# Altium footprint library SAMTEC SMD.PcbLib: 165 footprints (part 13 of 17) (continued)
## SAMTEC_SEAF-20-01-S-10-2-RA-GP-TR [mm] "200 Contacts in 10 rows (20 Pin per Row), Hi-Density Right Angle Open Pin Field Connector (Guide Post Option)" (continued)
  round 0.5 hole 1.3 unplated mask+0.4: MEC1(15.365,0) MEC2(-15.365,0)
  round 1.85 hole 1.15: MEC3(16.385,-6.16) MEC4(16.385,4.38) MEC5(-16.385,-6.16) MEC6(-16.385,4.38)
Top Overlay:
  lines w0.2: -15.964,-13.412 -15.9,-14.682 -14.122,-14.682 -14.059,-13.412 ; -14.097,7.975 -14.097,6.451 -16.129,6.451 ; -12.916,-2.744 -13.411,-2.744 -13.411,3.86 13.411,3.86 13.411,-2.744 12.256,-2.744 ; 14.059,-13.412 14.122,-14.682 15.9,-14.682 15.964,-13.412 ; 14.097,7.975 14.097,6.451 16.129,6.451 ; -16.129,6.451 -16.129,7.975 16.129,7.975 16.129,6.451 ; -16.129,6.451 -22.479,6.451 -22.479,-8.332 -16.04,-8.332 -16.04,-13.412 16.04,-13.412 16.04,-8.332 22.479,-8.332 22.479,6.451 16.129,6.451
  text "200" at 14.9,-12.5 h1.2
  text "1" at -12.575,1.35 h1.2
Mechanical 8:
  drawing of 156 lines, arcs and shapes, not listed
Mechanical 14:
  lines w0.1: -15.964,-13.412 -15.9,-14.682 -14.122,-14.682 -14.059,-13.412 ; -14.097,7.975 -14.097,6.451 -16.129,6.451 ; -12.802,-13.412 -12.802,-2.744 ; 12.802,-13.412 12.802,-2.744 ; 14.059,-13.412 14.122,-14.682 15.9,-14.682 15.964,-13.412 ; 14.097,7.975 14.097,6.451 16.129,6.451 ; -16.129,6.451 -16.129,7.975 16.129,7.975 16.129,6.451 ; -16.129,6.451 -22.479,6.451 -22.479,-8.332 -16.04,-8.332 -16.04,-13.412 16.04,-13.412 16.04,-8.332 22.479,-8.332 22.479,6.451 16.129,6.451 ; -13.411,-2.744 -13.411,3.86 13.411,3.86 13.411,-2.744 -13.411,-2.744
  text "200" at 14.9,-12.5 h1.2
  text "1" at -12.575,1.35 h1.2
Mechanical 15:
  lines w0.05: -22.729,-8.556 -16.29,-8.556 -16.29,-14.932 16.29,-14.932 16.29,-8.556 22.729,-8.556 22.729,6.727 16.379,6.727 16.379,8.251 -16.379,8.251 -16.379,6.727 -22.729,6.727 -22.729,-8.556
3D body "SAMTEC_SEAF-20-01-S-10-2-RA-GP-TR.stp": height 15.54, standoff 0, extent -22.479,-14.682 22.479,7.975

## SAMTEC_SEAF-30-01-L-10-2-RA-GP [mm] "300 Contacts in 10 rows (30 Pin per Row), Hi-Density Right Angle Open Pin Field Connector (Guide Post Option)"
height 15.53
pads (306):
  oval 0.84x0.63 smd paste+0.1: 1(-18.745,0) 2(-18.745,-2.159) 3(-18.745,-3.429) 4(-18.745,-4.699) 5(-18.745,-5.969) 6(-18.745,-7.239) 7(-18.745,-8.509) 8(-18.745,-9.779) 9(-18.745,-11.049) 10(-18.745,-12.319) 11(-17.475,0) 12(-17.475,-2.159) 13(-17.475,-3.429) 14(-17.475,-4.699) 15(-17.475,-5.969) 16(-17.475,-7.239) 17(-17.475,-8.509) 18(-17.475,-9.779) 19(-17.475,-11.049) 20(-17.475,-12.319) 21(-16.205,0) 22(-16.205,-2.159) 23(-16.205,-3.429) 24(-16.205,-4.699) 25(-16.205,-5.969) 26(-16.205,-7.239) 27(-16.205,-8.509) 28(-16.205,-9.779) 29(-16.205,-11.049) 30(-16.205,-12.319) 31(-14.935,0) 32(-14.935,-2.159) 33(-14.935,-3.429) 34(-14.935,-4.699) 35(-14.935,-5.969) 36(-14.935,-7.239) 37(-14.935,-8.509) 38(-14.935,-9.779) 39(-14.935,-11.049) 40(-14.935,-12.319) 41(-13.665,0) 42(-13.665,-2.159) 43(-13.665,-3.429) 44(-13.665,-4.699) 45(-13.665,-5.969) 46(-13.665,-7.239) 47(-13.665,-8.509) 48(-13.665,-9.779) 49(-13.665,-11.049) 50(-13.665,-12.319) 51(-12.395,0) 52(-12.395,-2.159) 53(-12.395,-3.429) 54(-12.395,-4.699) 55(-12.395,-5.969) 56(-12.395,-7.239) 57(-12.395,-8.509) 58(-12.395,-9.779) 59(-12.395,-11.049) 60(-12.395,-12.319) 61(-11.125,0) 62(-11.125,-2.159) 63(-11.125,-3.429) 64(-11.125,-4.699) 65(-11.125,-5.969) 66(-11.125,-7.239) 67(-11.125,-8.509) 68(-11.125,-9.779) 69(-11.125,-11.049) 70(-11.125,-12.319) 71(-9.855,0) 72(-9.855,-2.159) 73(-9.855,-3.429) 74(-9.855,-4.699) 75(-9.855,-5.969) 76(-9.855,-7.239) 77(-9.855,-8.509) 78(-9.855,-9.779) 79(-9.855,-11.049) 80(-9.855,-12.319) 81(-8.585,0) 82(-8.585,-2.159) 83(-8.585,-3.429) 84(-8.585,-4.699) 85(-8.585,-5.969) 86(-8.585,-7.239) 87(-8.585,-8.509) 88(-8.585,-9.779) 89(-8.585,-11.049) 90(-8.585,-12.319) 91(-7.315,0) 92(-7.315,-2.159) 93(-7.315,-3.429) 94(-7.315,-4.699) 95(-7.315,-5.969) 96(-7.315,-7.239) 97(-7.315,-8.509) 98(-7.315,-9.779) 99(-7.315,-11.049) 100(-7.315,-12.319) 101(-6.045,0) 102(-6.045,-2.159) 103(-6.045,-3.429) 104(-6.045,-4.699) 105(-6.045,-5.969) 106(-6.045,-7.239) 107(-6.045,-8.509) 108(-6.045,-9.779) 109(-6.045,-11.049) 110(-6.045,-12.319) 111(-4.775,0) 112(-4.775,-2.159) 113(-4.775,-3.429) 114(-4.775,-4.699) 115(-4.775,-5.969) 116(-4.775,-7.239) 117(-4.775,-8.509) 118(-4.775,-9.779) 119(-4.775,-11.049) 120(-4.775,-12.319) 121(-3.505,0) 122(-3.505,-2.159) 123(-3.505,-3.429) 124(-3.505,-4.699) 125(-3.505,-5.969) 126(-3.505,-7.239) 127(-3.505,-8.509) 128(-3.505,-9.779) 129(-3.505,-11.049) 130(-3.505,-12.319) 131(-2.235,0) 132(-2.235,-2.159) 133(-2.235,-3.429) 134(-2.235,-4.699) 135(-2.235,-5.969) 136(-2.235,-7.239) 137(-2.235,-8.509) 138(-2.235,-9.779) 139(-2.235,-11.049) 140(-2.235,-12.319) 141(-0.965,0) 142(-0.965,-2.159) 143(-0.965,-3.429) 144(-0.965,-4.699) 145(-0.965,-5.969) 146(-0.965,-7.239) 147(-0.965,-8.509) 148(-0.965,-9.779) 149(-0.965,-11.049) 150(-0.965,-12.319) 151(0.305,0) 152(0.305,-2.159) 153(0.305,-3.429) 154(0.305,-4.699) 155(0.305,-5.969) 156(0.305,-7.239) 157(0.305,-8.509) 158(0.305,-9.779) 159(0.305,-11.049) 160(0.305,-12.319) 161(1.575,0) 162(1.575,-2.159) 163(1.575,-3.429) 164(1.575,-4.699) 165(1.575,-5.969) 166(1.575,-7.239) 167(1.575,-8.509) 168(1.575,-9.779) 169(1.575,-11.049) 170(1.575,-12.319) 171(2.845,0) 172(2.845,-2.159) 173(2.845,-3.429) 174(2.845,-4.699) 175(2.845,-5.969) 176(2.845,-7.239) 177(2.845,-8.509) 178(2.845,-9.779) 179(2.845,-11.049) 180(2.845,-12.319) 181(4.115,0) 182(4.115,-2.159) 183(4.115,-3.429) 184(4.115,-4.699) 185(4.115,-5.969) 186(4.115,-7.239) 187(4.115,-8.509) 188(4.115,-9.779) 189(4.115,-11.049) 190(4.115,-12.319) 191(5.385,0) 192(5.385,-2.159) 193(5.385,-3.429) 194(5.385,-4.699) 195(5.385,-5.969) 196(5.385,-7.239) 197(5.385,-8.509) 198(5.385,-9.779) 199(5.385,-11.049) 200(5.385,-12.319) 201(6.655,0) 202(6.655,-2.159) 203(6.655,-3.429) 204(6.655,-4.699) 205(6.655,-5.969) 206(6.655,-7.239) 207(6.655,-8.509) 208(6.655,-9.779) 209(6.655,-11.049) 210(6.655,-12.319) 211(7.925,0) 212(7.925,-2.159) 213(7.925,-3.429) 214(7.925,-4.699) 215(7.925,-5.969) 216(7.925,-7.239) 217(7.925,-8.509) 218(7.925,-9.779) 219(7.925,-11.049) 220(7.925,-12.319) 221(9.195,0) 222(9.195,-2.159) 223(9.195,-3.429) 224(9.195,-4.699) 225(9.195,-5.969) 226(9.195,-7.239) 227(9.195,-8.509) 228(9.195,-9.779) 229(9.195,-11.049) 230(9.195,-12.319) 231(10.465,0) 232(10.465,-2.159) 233(10.465,-3.429) 234(10.465,-4.699) 235(10.465,-5.969) 236(10.465,-7.239) 237(10.465,-8.509) 238(10.465,-9.779) 239(10.465,-11.049) 240(10.465,-12.319) 241(11.735,0) 242(11.735,-2.159) 243(11.735,-3.429) 244(11.735,-4.699) 245(11.735,-5.969) 246(11.735,-7.239) 247(11.735,-8.509) 248(11.735,-9.779) 249(11.735,-11.049) 250(11.735,-12.319) 251(13.005,0) 252(13.005,-2.159) 253(13.005,-3.429) 254(13.005,-4.699) 255(13.005,-5.969) 256(13.005,-7.239) 257(13.005,-8.509) 258(13.005,-9.779) 259(13.005,-11.049) 260(13.005,-12.319) 261(14.275,0) 262(14.275,-2.159) 263(14.275,-3.429) 264(14.275,-4.699) 265(14.275,-5.969) 266(14.275,-7.239) 267(14.275,-8.509) 268(14.275,-9.779) 269(14.275,-11.049) 270(14.275,-12.319) 271(15.545,0) 272(15.545,-2.159) 273(15.545,-3.429) 274(15.545,-4.699) 275(15.545,-5.969) 276(15.545,-7.239) 277(15.545,-8.509) 278(15.545,-9.779) 279(15.545,-11.049) 280(15.545,-12.319) 281(16.815,0) 282(16.815,-2.159) 283(16.815,-3.429) 284(16.815,-4.699) 285(16.815,-5.969) 286(16.815,-7.239) 287(16.815,-8.509) 288(16.815,-9.779) 289(16.815,-11.049) 290(16.815,-12.319) 291(18.085,0) 292(18.085,-2.159) 293(18.085,-3.429) 294(18.085,-4.699) 295(18.085,-5.969) 296(18.085,-7.239) 297(18.085,-8.509) 298(18.085,-9.779) 299(18.085,-11.049) 300(18.085,-12.319)
  round 0.5 hole 1.3 unplated mask+0.4: MEC1(21.715,0) MEC2(-21.715,0)
  round 1.85 hole 1.15: MEC3(22.735,-6.16) MEC4(22.735,4.38) MEC5(-22.735,-6.16) MEC6(-22.735,4.38)
Top Overlay:
  lines w0.2: -22.479,6.477 -22.479,8.001 22.479,8.001 22.479,6.477 ; -22.167,8.001 -21.717,7.301 -21.267,8.001 ; -21.311,-13.386 -21.311,-14.58 -18.517,-14.58 ; -20.447,8.001 -20.447,6.477 -28.829,6.477 -28.829,-8.306 -24.435,-8.306 -24.435,-13.386 -18.517,-13.386 -18.517,-14.961 22.911,-14.961 22.911,-13.386 ; -19.812,-2.718 -19.812,3.886 19.685,3.886 19.685,-2.718 19.152,-2.718 19.152,-13.386 24.943,-13.386 24.943,-8.306 28.829,-8.306 28.829,6.477 20.447,6.477 20.447,8.001
  text "1" at -18.925,1.35 h1.2
  text "300" at 21.25,-12.5 h1.2
Mechanical 8:
  lines w0.05: -23.235,-6.16 -22.735,-6.16 ; -23.235,4.38 -22.735,4.38 ; -22.735,-6.66 -22.735,-6.16 ; -22.735,-5.66 -22.735,-6.16 ; -22.735,3.88 -22.735,4.38 ; -22.735,4.88 -22.735,4.38 ; -22.235,-6.16 -22.735,-6.16 ; -22.235,4.38 -22.735,4.38 ; -22.215,0 -21.715,0 ; -21.715,-0.5 -21.715,0 ; -21.715,0.5 -21.715,0 ; -21.215,0 -21.715,0 ; -19.245,-12.32 -18.745,-12.32 ; -19.245,-11.05 -18.745,-11.05 ; -19.245,-9.78 -18.745,-9.78 ; -19.245,-8.51 -18.745,-8.51 ; -19.245,-7.24 -18.745,-7.24 ; -19.245,-5.97 -18.745,-5.97 ; -19.245,-4.7 -18.745,-4.7 ; -19.245,-3.43 -18.745,-3.43 ; -19.245,-2.16 -18.745,-2.16 ; -19.245,0 -18.745,0 ; -18.745,-12.82 -18.745,-12.32 ; -18.745,-11.82 -18.745,-12.32 ; -18.745,-11.55 -18.745,-11.05 ; -18.745,-10.55 -18.745,-11.05 ; -18.745,-10.28 -18.745,-9.78 ; -18.745,-9.28 -18.745,-9.78 ; -18.745,-9.01 -18.745,-8.51 ; -18.745,-8.01 -18.745,-8.51 ; -18.745,-7.74 -18.745,-7.24 ; -18.745,-6.74 -18.745,-7.24 ; -18.745,-6.47 -18.745,-5.97 ; -18.745,-5.47 -18.745,-5.97 ; -18.745,-5.2 -18.745,-4.7 ; -18.745,-4.2 -18.745,-4.7 ; -18.745,-3.93 -18.745,-3.43 ; -18.745,-2.93 -18.745,-3.43 ; -18.745,-2.66 -18.745,-2.16 ; -18.745,-1.66 -18.745,-2.16 ; -18.745,-0.5 -18.745,0 ; -18.745,0.5 -18.745,0 ; -18.245,-12.32 -18.745,-12.32 ; -18.245,-11.05 -18.745,-11.05 ; -18.245,-9.78 -18.745,-9.78 ; -18.245,-8.51 -18.745,-8.51 ; -18.245,-7.24 -18.745,-7.24 ; -18.245,-5.97 -18.745,-5.97 ; -18.245,-4.7 -18.745,-4.7 ; -18.245,-3.43 -18.745,-3.43 ; -18.245,-2.16 -18.745,-2.16 ; -18.245,0 -18.745,0 ; -0.5,0 0,0 ; -0.195,0 0.305,0 ; 0,-0.5 0,0 ; 0,0.5 0,0 ; 0.305,-0.5 0.305,0 ; 0.305,0.5 0.305,0 ; 0.5,0 0,0 ; 0.805,0 0.305,0 ; 17.585,-12.32 18.085,-12.32 ; 17.585,-11.05 18.085,-11.05 ; 17.585,-9.78 18.085,-9.78 ; 17.585,-8.51 18.085,-8.51 ; 17.585,-7.24 18.085,-7.24 ; 17.585,-5.97 18.085,-5.97 ; 17.585,-4.7 18.085,-4.7 ; 17.585,-3.43 18.085,-3.43 ; 17.585,-2.16 18.085,-2.16 ; 17.585,0 18.085,0 ; 18.085,-12.82 18.085,-12.32 ; 18.085,-11.82 18.085,-12.32 ; 18.085,-11.55 18.085,-11.05 ; 18.085,-10.55 18.085,-11.05 ; 18.085,-10.28 18.085,-9.78 ; 18.085,-9.28 18.085,-9.78 ; 18.085,-9.01 18.085,-8.51 ; 18.085,-8.01 18.085,-8.51 ; 18.085,-7.74 18.085,-7.24 ; 18.085,-6.74 18.085,-7.24 ; 18.085,-6.47 18.085,-5.97 ; 18.085,-5.47 18.085,-5.97 ; 18.085,-5.2 18.085,-4.7 ; 18.085,-4.2 18.085,-4.7 ; 18.085,-3.93 18.085,-3.43 ; 18.085,-2.93 18.085,-3.43 ; 18.085,-2.66 18.085,-2.16 ; 18.085,-1.66 18.085,-2.16 ; 18.085,-0.5 18.085,0 ; 18.085,0.5 18.085,0 ; 18.585,-12.32 18.085,-12.32 ; 18.585,-11.05 18.085,-11.05 ; 18.585,-9.78 18.085,-9.78 ; 18.585,-8.51 18.085,-8.51 ; 18.585,-7.24 18.085,-7.24 ; 18.585,-5.97 18.085,-5.97 ; 18.585,-4.7 18.085,-4.7 ; 18.585,-3.43 18.085,-3.43 ; 18.585,-2.16 18.085,-2.16 ; 18.585,0 18.085,0 ; 21.215,0 21.715,0 ; 21.715,-0.5 21.715,0 ; 21.715,0.5 21.715,0 ; 22.215,0 21.715,0 ; 22.235,-6.16 22.735,-6.16 ; 22.235,4.38 22.735,4.38 ; 22.735,-6.66 22.735,-6.16 ; 22.735,-5.66 22.735,-6.16 ; 22.735,3.88 22.735,4.38 ; 22.735,4.88 22.735,4.38 ; 23.235,-6.16 22.735,-6.16 ; 23.235,4.38 22.735,4.38
  lines w0.1: -28.829,5.84 28.829,5.84
Mechanical 14:
  lines w0.1: -22.479,6.477 -22.479,8.001 22.479,8.001 22.479,6.477 ; -22.167,8.001 -21.717,7.301 -21.267,8.001 ; -21.311,-13.386 -21.311,-14.58 -18.517,-14.58 ; -20.447,8.001 -20.447,6.477 -28.829,6.477 -28.829,-8.306 -24.435,-8.306 -24.435,-13.386 -19.152,-13.386 -19.152,-2.718 ; -19.812,-2.718 -19.812,3.886 19.685,3.886 19.685,-2.718 ; -19.152,-12.878 19.152,-12.878 ; -18.517,-12.878 -18.517,-14.961 22.911,-14.961 22.911,-13.386 ; 19.152,-2.718 19.152,-13.386 24.943,-13.386 24.943,-8.306 28.829,-8.306 28.829,6.477 20.447,6.477 20.447,8.001
  text "1" at -18.925,1.35 h1.2
  text "300" at 21.25,-12.5 h1.2
Mechanical 15:
  lines w0.05: -29.079,-8.556 -29.079,6.727 -22.729,6.727 -22.729,8.251 22.729,8.251 22.729,6.727 29.079,6.727 29.079,-8.556 25.193,-8.556 25.193,-13.636 23.161,-13.636 23.161,-15.211 22.911,-15.211 -18.767,-15.211 -18.767,-14.83 -21.561,-14.83 -21.561,-13.636 -24.685,-13.636 -24.685,-8.556 -29.079,-8.556
3D body "SAMTEC_SEAF-30-01-L-10-2-RA-GP.stp": height 15.54, standoff -1.5, extent -28.829,-14.96 28.829,8.001

## SAMTEC_SEAF-40-05.0-S-08-2-A-K [mm] "320 contacts (8 rows x 40 Columns) High-Speed/High-Density Open-Pin-Field Connector"
height 5.05
pads (322):
  round 0.64 smd paste+0.125: 1(-24.765,4.445) 2(-24.765,3.175) 3(-24.765,1.905) 4(-24.765,0.635) 5(-24.765,-0.635) 6(-24.765,-1.905) 7(-24.765,-3.175) 8(-24.765,-4.445) 9(-23.495,4.445) 10(-23.495,3.175) 11(-23.495,1.905) 12(-23.495,0.635) 13(-23.495,-0.635) 14(-23.495,-1.905) 15(-23.495,-3.175) 16(-23.495,-4.445) 17(-22.225,4.445) 18(-22.225,3.175) 19(-22.225,1.905) 20(-22.225,0.635) 21(-22.225,-0.635) 22(-22.225,-1.905) 23(-22.225,-3.175) 24(-22.225,-4.445) 25(-20.955,4.445) 26(-20.955,3.175) 27(-20.955,1.905) 28(-20.955,0.635) 29(-20.955,-0.635) 30(-20.955,-1.905) 31(-20.955,-3.175) 32(-20.955,-4.445) 33(-19.685,4.445) 34(-19.685,3.175) 35(-19.685,1.905) 36(-19.685,0.635) 37(-19.685,-0.635) 38(-19.685,-1.905) 39(-19.685,-3.175) 40(-19.685,-4.445) 41(-18.415,4.445) 42(-18.415,3.175) 43(-18.415,1.905) 44(-18.415,0.635) 45(-18.415,-0.635) 46(-18.415,-1.905) 47(-18.415,-3.175) 48(-18.415,-4.445) 49(-17.145,4.445) 50(-17.145,3.175) 51(-17.145,1.905) 52(-17.145,0.635) 53(-17.145,-0.635) 54(-17.145,-1.905) 55(-17.145,-3.175) 56(-17.145,-4.445) 57(-15.875,4.445) 58(-15.875,3.175) 59(-15.875,1.905) 60(-15.875,0.635) 61(-15.875,-0.635) 62(-15.875,-1.905) 63(-15.875,-3.175) 64(-15.875,-4.445) 65(-14.605,4.445) 66(-14.605,3.175) 67(-14.605,1.905) 68(-14.605,0.635) 69(-14.605,-0.635) 70(-14.605,-1.905) 71(-14.605,-3.175) 72(-14.605,-4.445) 73(-13.335,4.445) 74(-13.335,3.175) 75(-13.335,1.905) 76(-13.335,0.635) 77(-13.335,-0.635) 78(-13.335,-1.905) 79(-13.335,-3.175) 80(-13.335,-4.445) 81(-12.065,4.445) 82(-12.065,3.175) 83(-12.065,1.905) 84(-12.065,0.635) 85(-12.065,-0.635) 86(-12.065,-1.905) 87(-12.065,-3.175) 88(-12.065,-4.445) 89(-10.795,4.445) 90(-10.795,3.175) 91(-10.795,1.905) 92(-10.795,0.635) 93(-10.795,-0.635) 94(-10.795,-1.905) 95(-10.795,-3.175) 96(-10.795,-4.445) 97(-9.525,4.445) 98(-9.525,3.175) 99(-9.525,1.905) 100(-9.525,0.635) 101(-9.525,-0.635) 102(-9.525,-1.905) 103(-9.525,-3.175) 104(-9.525,-4.445) 105(-8.255,4.445) 106(-8.255,3.175) 107(-8.255,1.905) 108(-8.255,0.635) 109(-8.255,-0.635) 110(-8.255,-1.905) 111(-8.255,-3.175) 112(-8.255,-4.445) 113(-6.985,4.445) 114(-6.985,3.175) 115(-6.985,1.905) 116(-6.985,0.635) 117(-6.985,-0.635) 118(-6.985,-1.905) 119(-6.985,-3.175) 120(-6.985,-4.445) 121(-5.715,4.445) 122(-5.715,3.175) 123(-5.715,1.905) 124(-5.715,0.635) 125(-5.715,-0.635) 126(-5.715,-1.905) 127(-5.715,-3.175) 128(-5.715,-4.445) 129(-4.445,4.445) 130(-4.445,3.175) 131(-4.445,1.905) 132(-4.445,0.635) 133(-4.445,-0.635) 134(-4.445,-1.905) 135(-4.445,-3.175) 136(-4.445,-4.445) 137(-3.175,4.445) 138(-3.175,3.175) 139(-3.175,1.905) 140(-3.175,0.635) 141(-3.175,-0.635) 142(-3.175,-1.905) 143(-3.175,-3.175) 144(-3.175,-4.445) 145(-1.905,4.445) 146(-1.905,3.175) 147(-1.905,1.905) 148(-1.905,0.635) 149(-1.905,-0.635) 150(-1.905,-1.905) 151(-1.905,-3.175) 152(-1.905,-4.445) 153(-0.635,4.445) 154(-0.635,3.175) 155(-0.635,1.905) 156(-0.635,0.635) 157(-0.635,-0.635) 158(-0.635,-1.905) 159(-0.635,-3.175) 160(-0.635,-4.445) 161(0.635,4.445) 162(0.635,3.175) 163(0.635,1.905) 164(0.635,0.635) 165(0.635,-0.635) 166(0.635,-1.905) 167(0.635,-3.175) 168(0.635,-4.445) 169(1.905,4.445) 170(1.905,3.175) 171(1.905,1.905) 172(1.905,0.635) 173(1.905,-0.635) 174(1.905,-1.905) 175(1.905,-3.175) 176(1.905,-4.445) 177(3.175,4.445) 178(3.175,3.175) 179(3.175,1.905) 180(3.175,0.635) 181(3.175,-0.635) 182(3.175,-1.905) 183(3.175,-3.175) 184(3.175,-4.445) 185(4.445,4.445) 186(4.445,3.175) 187(4.445,1.905) 188(4.445,0.635) 189(4.445,-0.635) 190(4.445,-1.905) 191(4.445,-3.175) 192(4.445,-4.445) 193(5.715,4.445) 194(5.715,3.175) 195(5.715,1.905) 196(5.715,0.635) 197(5.715,-0.635) 198(5.715,-1.905) 199(5.715,-3.175) 200(5.715,-4.445) 201(6.985,4.445) 202(6.985,3.175) 203(6.985,1.905) 204(6.985,0.635) 205(6.985,-0.635) 206(6.985,-1.905) 207(6.985,-3.175) 208(6.985,-4.445) 209(8.255,4.445) 210(8.255,3.175) 211(8.255,1.905) 212(8.255,0.635) 213(8.255,-0.635) 214(8.255,-1.905) 215(8.255,-3.175) 216(8.255,-4.445) 217(9.525,4.445) 218(9.525,3.175) 219(9.525,1.905) 220(9.525,0.635) 221(9.525,-0.635) 222(9.525,-1.905) 223(9.525,-3.175) 224(9.525,-4.445) 225(10.795,4.445) 226(10.795,3.175) 227(10.795,1.905) 228(10.795,0.635) 229(10.795,-0.635) 230(10.795,-1.905) 231(10.795,-3.175) 232(10.795,-4.445) 233(12.065,4.445) 234(12.065,3.175) 235(12.065,1.905) 236(12.065,0.635) 237(12.065,-0.635) 238(12.065,-1.905) 239(12.065,-3.175) 240(12.065,-4.445) 241(13.335,4.445) 242(13.335,3.175) 243(13.335,1.905) 244(13.335,0.635) 245(13.335,-0.635) 246(13.335,-1.905) 247(13.335,-3.175) 248(13.335,-4.445) 249(14.605,4.445) 250(14.605,3.175) 251(14.605,1.905) 252(14.605,0.635) 253(14.605,-0.635) 254(14.605,-1.905) 255(14.605,-3.175) 256(14.605,-4.445) 257(15.875,4.445) 258(15.875,3.175) 259(15.875,1.905) 260(15.875,0.635) 261(15.875,-0.635) 262(15.875,-1.905) 263(15.875,-3.175) 264(15.875,-4.445) 265(17.145,4.445) 266(17.145,3.175) 267(17.145,1.905) 268(17.145,0.635) 269(17.145,-0.635) 270(17.145,-1.905) 271(17.145,-3.175) 272(17.145,-4.445) 273(18.415,4.445) 274(18.415,3.175) 275(18.415,1.905) 276(18.415,0.635) 277(18.415,-0.635) 278(18.415,-1.905) 279(18.415,-3.175) 280(18.415,-4.445) 281(19.685,4.445) 282(19.685,3.175) 283(19.685,1.905) 284(19.685,0.635) 285(19.685,-0.635) 286(19.685,-1.905) 287(19.685,-3.175) 288(19.685,-4.445) 289(20.955,4.445) 290(20.955,3.175) 291(20.955,1.905) 292(20.955,0.635) 293(20.955,-0.635) 294(20.955,-1.905) 295(20.955,-3.175) 296(20.955,-4.445) 297(22.225,4.445) 298(22.225,3.175) 299(22.225,1.905) 300(22.225,0.635) 301(22.225,-0.635) 302(22.225,-1.905) 303(22.225,-3.175) 304(22.225,-4.445) 305(23.495,4.445) 306(23.495,3.175) 307(23.495,1.905) 308(23.495,0.635) 309(23.495,-0.635) 310(23.495,-1.905) 311(23.495,-3.175) 312(23.495,-4.445) 313(24.765,4.445) 314(24.765,3.175) 315(24.765,1.905) 316(24.765,0.635) 317(24.765,-0.635) 318(24.765,-1.905) 319(24.765,-3.175) 320(24.765,-4.445)
  round 0.5 hole 1.3 unplated mask+0.4: MEC1(-27.19,3.05) MEC2(27.19,0)
Top Overlay:
  lines w0.2: -27.889,2.064 -27.889,1.6 -28.727,1.6 -28.727,-1.6 -27.889,-1.6 -27.889,-5.372 28.727,-5.372 28.727,-0.927 27.889,-0.927 ; -27.889,3.969 -27.889,5.372 28.727,5.372 28.727,0.927 27.889,0.927 ; -27.051,1.905 -27.051,0.94 -28.067,0.94 -28.067,-0.94 -27.051,-0.94 -27.051,-4.585 -25.876,-4.585 ; -27.051,4.127 -27.051,4.585 -25.876,4.585 ; 26.194,-4.585 28.067,-4.585 28.067,-1.587 27.051,-1.587 27.051,-1.111 ; 26.194,4.585 28.067,4.585 28.067,1.587 27.051,1.587 27.051,1.111
  text "320" at 23.613,-6.972 h1
  text "1" at -24.924,6.032 h1
Mechanical 8:
  circle w0.05: c-27.19,3.05 r0.65
  circle w0.05: c27.19,0 r0.65
  lines w0.05: -27.69,3.05 -27.19,3.05 ; -27.19,2.55 -27.19,3.05 ; -27.19,3.55 -27.19,3.05 ; -26.69,3.05 -27.19,3.05 ; -25.265,-4.445 -24.765,-4.445 ; -25.265,-3.175 -24.765,-3.175 ; -25.265,-1.905 -24.765,-1.905 ; -25.265,-0.635 -24.765,-0.635 ; -25.265,0.635 -24.765,0.635 ; -25.265,1.905 -24.765,1.905 ; -25.265,3.175 -24.765,3.175 ; -25.265,4.445 -24.765,4.445 ; -24.765,-4.945 -24.765,-4.445 ; -24.765,-3.945 -24.765,-4.445 ; -24.765,-3.675 -24.765,-3.175 ; -24.765,-2.675 -24.765,-3.175 ; -24.765,-2.405 -24.765,-1.905 ; -24.765,-1.405 -24.765,-1.905 ; -24.765,-1.135 -24.765,-0.635 ; -24.765,-0.135 -24.765,-0.635 ; -24.765,0.135 -24.765,0.635 ; -24.765,1.135 -24.765,0.635 ; -24.765,1.405 -24.765,1.905 ; -24.765,2.405 -24.765,1.905 ; -24.765,2.675 -24.765,3.175 ; -24.765,3.675 -24.765,3.175 ; -24.765,3.945 -24.765,4.445 ; -24.765,4.945 -24.765,4.445 ; -24.265,-4.445 -24.765,-4.445 ; -24.265,-3.175 -24.765,-3.175 ; -24.265,-1.905 -24.765,-1.905 ; -24.265,-0.635 -24.765,-0.635 ; -24.265,0.635 -24.765,0.635 ; -24.265,1.905 -24.765,1.905 ; -24.265,3.175 -24.765,3.175 ; -24.265,4.445 -24.765,4.445 ; -0.5,0 0,0 ; 0,-0.5 0,0 ; 0,0.5 0,0 ; 0.5,0 0,0 ; 1.905,-0.635 1.905,-0.135 ; 3.175,-0.635 3.175,-0.135 ; 4.445,-0.635 4.445,-0.135 ; 5.715,-0.635 5.715,-0.135 ; 6.985,-0.635 6.985,-0.135 ; 8.255,-0.635 8.255,-0.135 ; 9.525,-0.635 9.525,-0.135 ; 10.795,-0.635 10.795,-0.135 ; 12.065,-0.635 12.065,-0.135 ; 13.335,-0.635 13.335,-0.135 ; 14.605,-0.635 14.605,-0.135 ; 15.875,-0.635 15.875,-0.135 ; 17.145,-0.635 17.145,-0.135 ; 18.415,-0.635 18.415,-0.135 ; 19.685,-0.635 19.685,-0.135 ; 20.955,-0.635 20.955,-0.135 ; 22.225,-0.635 22.225,-0.135 ; 23.495,-0.635 23.495,-0.135 ; 24.265,-4.445 24.765,-4.445 ; 24.265,-3.175 24.765,-3.175 ; 24.265,-1.905 24.765,-1.905 ; 24.265,-0.635 24.765,-0.635 ; 24.265,0.635 24.765,0.635 ; 24.265,1.905 24.765,1.905 ; 24.265,3.175 24.765,3.175 ; 24.265,4.445 24.765,4.445 ; 24.765,-4.945 24.765,-4.445 ; 24.765,-3.945 24.765,-4.445 ; 24.765,-3.675 24.765,-3.175 ; 24.765,-2.675 24.765,-3.175 ; 24.765,-2.405 24.765,-1.905 ; 24.765,-1.405 24.765,-1.905 ; 24.765,-1.135 24.765,-0.635 ; 24.765,-0.135 24.765,-0.635 ; 24.765,0.135 24.765,0.635 ; 24.765,1.135 24.765,0.635 ; 24.765,1.405 24.765,1.905 ; 24.765,2.405 24.765,1.905 ; 24.765,2.675 24.765,3.175 ; 24.765,3.675 24.765,3.175 ; 24.765,3.945 24.765,4.445 ; 24.765,4.945 24.765,4.445 ; 25.265,-4.445 24.765,-4.445 ; 25.265,-3.175 24.765,-3.175 ; 25.265,-1.905 24.765,-1.905 ; 25.265,-0.635 24.765,-0.635 ; 25.265,0.635 24.765,0.635 ; 25.265,1.905 24.765,1.905 ; 25.265,3.175 24.765,3.175 ; 25.265,4.445 24.765,4.445 ; 26.69,0 27.19,0 ; 27.19,-0.5 27.19,0 ; 27.19,0.5 27.19,0 ; 27.69,0 27.19,0
Mechanical 14:
  drawing of 267 lines, arcs and shapes, not listed
  text "320" at 23.613,-6.972 h1
  text "1" at -24.924,6.032 h1
  text "1" at -24.924,6.032 h1
Mechanical 15:
  lines w0.05: -28.977,-1.85 -28.139,-1.85 -28.139,-5.622 28.977,-5.622 28.977,5.622 -28.139,5.622 -28.139,5.372 -28.139,1.85 -28.977,1.85 -28.977,-1.85
3D body "SAMTEC_SEAF-40-05.0-S-08-2-A-K.stp": height 5.05, standoff -1.27, extent -28.727,-5.372 28.727,5.372